# Altium footprint library Footprint.PcbLib: 137 footprints (part 5 of 9)
Each footprint in its own frame and in the unit in brackets; x right, y up, seen from the top. Pads: shape width x height; smd on the part's side, far side on the other; paste and mask are expansions set on the pad; w line width, h text height; cw(c..) or ccw(c..) is an arc to the next point about the centre after c.
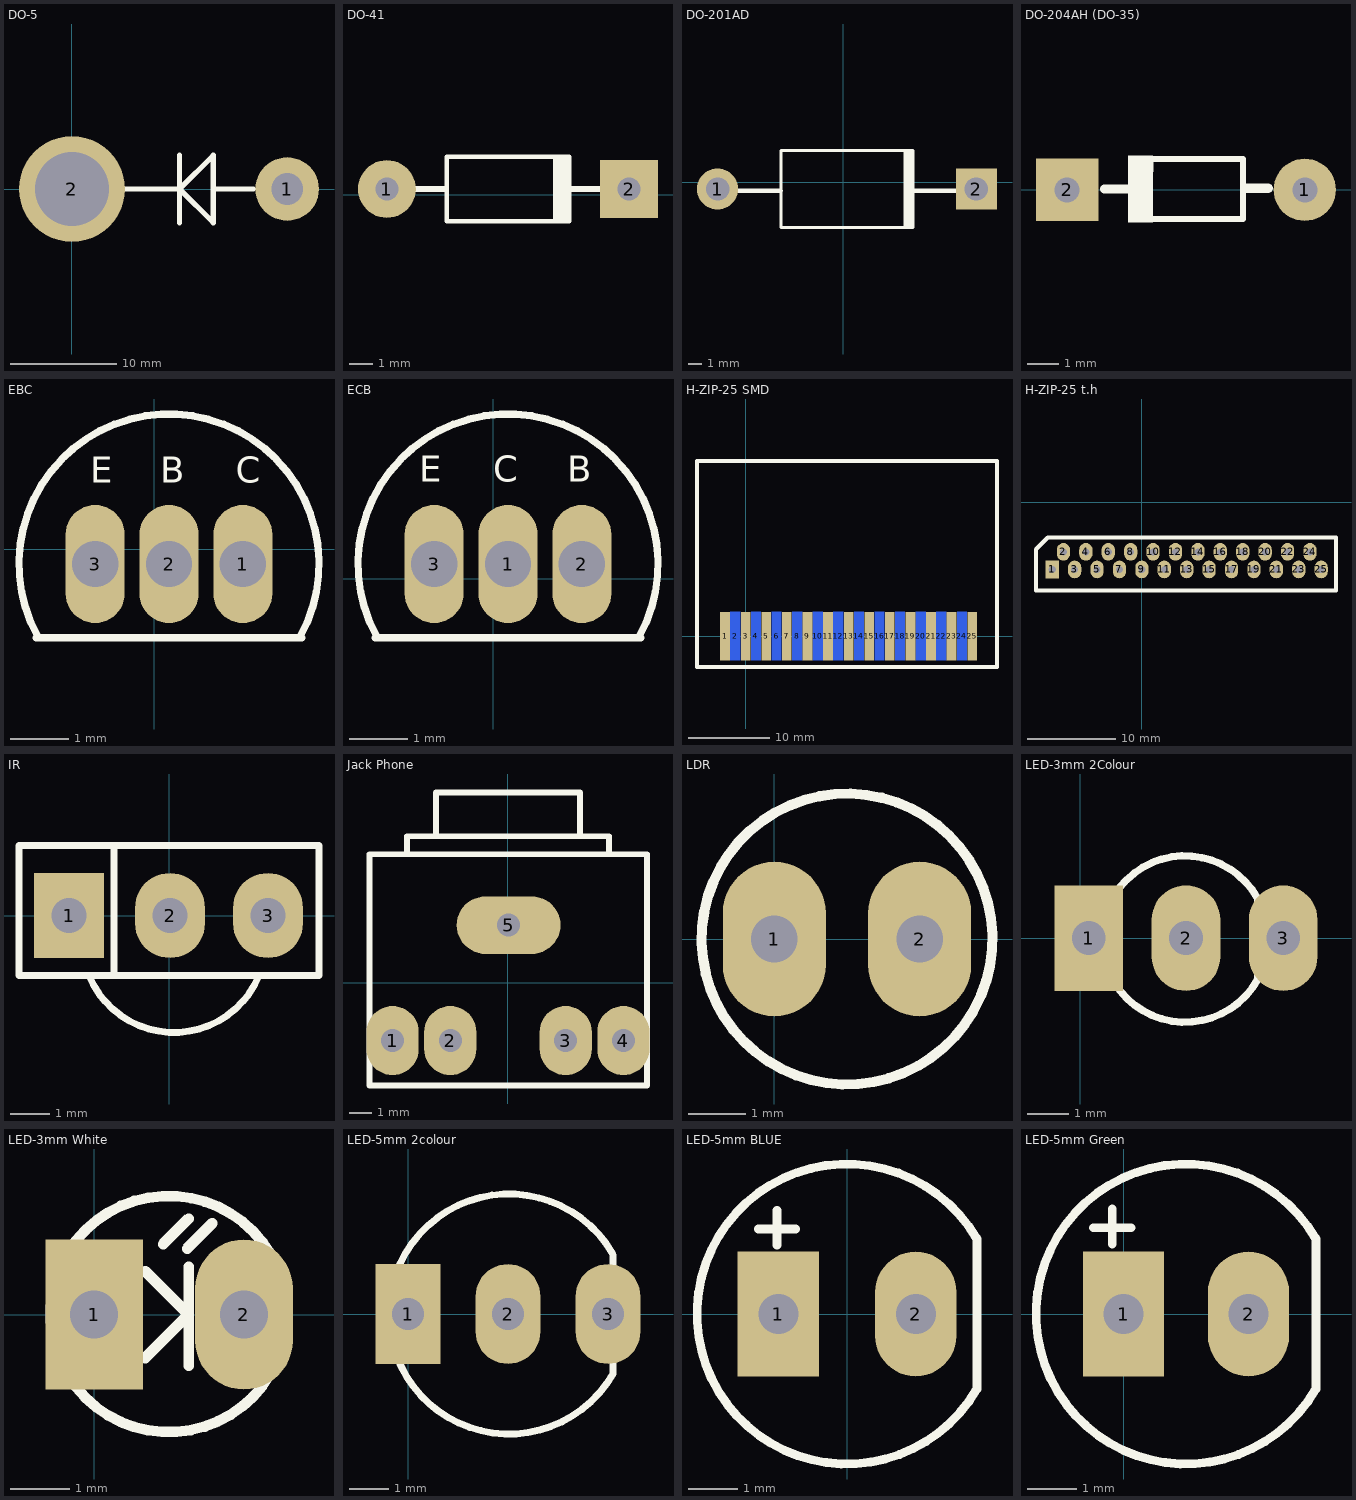
[diagram p4: the footprints below, top view; thin cyan lines are the x and y axes]

## DO-5 [mm] "diode power"
pads (2):
  round 6 hole 3: 1(20.32,0)
  round 10 hole 7: 2(0,0)
Top Overlay:
  lines w0.5: 5.08,0 10.16,0 ; 10.16,-3.175 10.16,3.175 ; 17.145,0 13.335,0 ; 10.16,0 13.335,3.175 13.335,0 ; 10.16,0 13.335,-3.175 13.335,0
3D body "User Library-DO-203AA_DO-4.step": height 20.3, standoff -11.5, extent -6.369,-5.17 6.147,5.83

## DO-41 [mm] "Diode pitch=300mils"
pads (2):
  round 2.5 hole 1: 1(-30.122,0.254)
  rect 2.5x2.5 hole 1: 2(-19.662,0.254)
Top Overlay:
  rectangle: -22.942,-1.146 -22.142,1.654
  lines w0.2: -22.242,-1.146 -27.542,-1.146 -27.542,1.654 -22.242,1.654
  lines w0.254: -30.099,0.254 -27.559,0.254 ; -22.225,0.254 -19.685,0.254
3D body "User Library-DO-41 10mm.step": height 3.36, standoff -2, extent -30.293,-1.108 -19.433,1.617

## DO-201AD [mm] "diode pitch=750mils"
pads (2):
  round 3 hole 1.7: 1(-9.144,-0.508)
  rect 3x3 hole 1.7: 2(9.696,-0.508)
Top Overlay:
  rectangle: 4.376,-3.308 5.176,2.292
  lines w0.2: 5.076,-3.308 -4.524,-3.308 -4.524,2.292 5.076,2.292
  lines w0.3: -7.62,-0.635 -4.524,-0.635 ; 4.953,-0.635 8.128,-0.635
3D body "User Library-DO-201ADDO-27.step": height 6.82, standoff -2.8, extent -9.943,-3.481 10.197,2.159

## DO-204AH (DO-35) [mm] "DO-204AH pitch=300mils"
pads (2):
  round 2 hole 0.8: 1(-2.54,0)
  rect 2x2 hole 0.8: 2(-10.16,0)
Top Overlay:
  rectangle: -8.204,-1.041 -7.404,1.092
  lines w0.2: -7.599,-0.94 -4.521,-0.94 -4.521,0.991 -7.497,0.991 -7.497,0.61
  lines w0.3: -8.963,0.025 -7.696,0.025 ; -4.47,0.051 -3.708,0.051
3D body "User Library-DO-204AH (DO-35).step": height 2.21, standoff -1.8, extent -10.318,-0.985 -2.178,1.035

## EBC [mil] "Transistor EBC"
pads (3):
  oval 40x80 hole 31.49 unplated: 1(60,-10) 2(10,-10) 3(-40,-10)
Top Overlay:
  lines w5: -80,-60 100,-60 ; -78.94,-59.1 cw(c10,-10) 98.94,-59.1
  text "C" at 55.12,39.37 h30
  text "B" at 3.94,39.37 h30
  text "E" at -43.31,39.37 h30
3D body: height 314.96, standoff 157.48, extent -79.57,-58.23 97.6,79.57
3D body: height 196.85, standoff -39.37, extent 46.42,-20.78 69.99,2.75
3D body: height 196.85, standoff -39.37, extent -2.8,-21.76 20.78,1.76
3D body: height 196.85, standoff -39.37, extent -53.98,-20.78 -30.4,2.75

## ECB [mil] "Transistor ECB"
pads (3):
  oval 40x80 hole 31.49 unplated: 1(10,10) 2(60,10) 3(-40,10)
Top Overlay:
  lines w5: -80,-40 100,-40 ; -78.94,-39.1 cw(c10,10) 98.94,-39.1
  text "C" at 0,60 h30
  text "B" at 50,60 h30
  text "E" at -50,60 h30
3D body: height 314.96, standoff 157.48, extent -79.57,-38.23 97.6,99.57
3D body: height 196.85, standoff -39.37, extent 46.42,-0.78 69.99,22.75
3D body: height 196.85, standoff -39.37, extent -2.8,-1.76 20.78,21.76
3D body: height 196.85, standoff -39.37, extent -53.98,-0.78 -30.4,22.75

## H-ZIP-25 SMD [mm] "H-ZIP-25 SMD"
pads (25):
  rect 1.2x6 smd: 1(-2.54,0) 3(0,0) 5(2.54,0) 7(5.08,0) 9(7.62,0) 11(10.16,0) 13(12.7,0) 15(15.24,0) 17(17.78,0) 19(20.32,0) 21(22.86,0) 23(25.4,0) 25(27.94,0)
  rect 1.2x6 smd far side: 2(-1.27,0) 4(1.27,0) 6(3.81,0) 8(6.35,0) 10(8.89,0) 12(11.43,0) 14(13.97,0) 16(16.51,0) 18(19.05,0) 20(21.59,0) 22(24.13,0) 24(26.67,0)
Top Overlay:
  lines w0.5: -6,-3.81 -6,21.59 31,21.59 31,-3.81 -6,-3.81
Bottom Overlay:
  lines w0.5: -6,-3.81 -6,21.59 31,21.59 31,-3.81 -6,-3.81
3D body "User Library-HZIP25-P1_27mm.step": height 1.12, standoff -3.88, extent -5.3,0.891 30.7,21.59

## H-ZIP-25 t.h [mm] "HZIP-25 (TB6560)"
pads (25):
  rect 1.5x2 hole 0.8: 1(-10.16,-7.62)
  oval 1.5x2 hole 0.8: 2(-8.89,-5.62) 3(-7.62,-7.62) 4(-6.35,-5.62) 5(-5.08,-7.62) 6(-3.81,-5.62) 7(-2.54,-7.62) 8(-1.27,-5.62) 9(0,-7.62) 10(1.27,-5.62) 11(2.54,-7.62) 12(3.81,-5.62) 13(5.08,-7.62) 14(6.35,-5.62) 15(7.62,-7.62) 16(8.89,-5.62) 17(10.16,-7.62) 18(11.43,-5.62) 19(12.7,-7.62) 20(13.97,-5.62) 21(15.24,-7.62) 22(16.51,-5.62) 23(17.78,-7.62) 24(19.05,-5.62) 25(20.32,-7.62)
Top Overlay:
  lines w0.5: -12,-10 -12,-9 -12,-5.32 -10.68,-4 22,-4 22,-10 -12,-10
3D body "User Library-HZIP25-P1_27mm.step": height 18.7, standoff -2, extent -12.962,-8.073 23.038,-3.073

## IR [mil] "mat thu hong ngoai"
pads (3):
  rect 70x85 hole 35: 1(-100,0)
  oval 70x85 hole 35: 2(1,0) 3(99,0)
Top Overlay:
  lines w7: -80,-60 ccw(c5,-25) 90,-60 ; -55,-60 -55,70 ; -150,-60 -150,70 150,70 150,-60 -150,-60
3D body "User Library-Parallax-IR.step": height 393.7, standoff -78.74, extent -135.59,-160 140,376.42

## Jack Phone [mil] "Jac Phone Stereo"
pads (5):
  oval 90.55x120 hole 40: 1(-200,-100) 2(-100,-100) 3(100,-100) 4(200,-100)
  oval 180x100 hole 40: 5(1,100)
Top Overlay:
  lines w10: -240,219 -240,-178 ; -175,224 -175,254 175,254 175,226 174,225 ; -125,255 -125,330 125,330 ; 125,329 125,256 126,255 ; 240,-178 -240,-178 ; -240,-178 241,-178 241,223 -240,223 -240,-178
3D body "SW3dPS-CONNECTOR, PHONE JACK, STEREO, 3.5 MM, SEE-PLUS ST-3536-02HG.STEP": height 394.3, standoff -137.19, extent -239,-201.56 233.44,353.56

## LDR [mm] "QUANG TRO"
height 7.62
pads (2):
  oval 1.8x2.7 hole 0.813: 1(0,0) 2(2.54,0)
Top Overlay:
  lines w0.178: 3.47,-1.269 cw(c1.27,0) 3.49,-1.234
3D body "LDR.STEP": height 3.51, standoff -1.23, extent -1.335,-2.032 3.875,2.268

## LED-3mm 2Colour [mil] "LED-3mm 2Colour"
height 300
pads (3):
  rect 65x100 hole 32: 1(8,0)
  oval 65x100 hole 32: 2(100,0) 3(192,0)
Top Overlay:
  lines w7: 168,-39 168,37
  lines w7.01: 167.87,37.48 ccw(c99.08,-0.84) 167.97,-38.98
3D body "User Library-LED RG.step": height 371.26, standoff -157.48, extent 9.83,-81.48 187,75.99

## LED-3mm White [mil] "LED-3mm White"
height 300
pads (2):
  rect 65x100 hole 32: 1(0,0)
  oval 65x100 hole 32: 2(100,0)
Top Overlay:
  lines w7: 34,-29 63,0 34,29 ; 46,47 63,64 ; 62,44 79,61 ; 63,-34 63,32 ; 117.92,-39.35 117.92,39.84
  lines w7.01: 117.57,-39.74 cw(c49.8,0.35) 117.72,40.19
3D body "SW3DPS-LED DIP 3MM-DEFAULT.STEP": height 217.14, standoff -117.51, extent -24.8,-74.81 112.99,74.8

## LED-5mm 2colour [mil] "LED-5mm 2colour"
height 300
pads (3):
  rect 65x100 hole 32: 1(0,0)
  oval 65x100 hole 32: 2(100,0) 3(200,0)
Top Overlay:
  lines w7: 204.51,60.71 ccw(c101,0) 204.94,-59.97 ; 205,-59 205,59
3D body "User Library-5mmBiColorLED.step": height 426.6, standoff -102.4, extent -16,-115.98 210,115.98

## LED-5mm BLUE [mil] "LED-5mm BLUE"
height 300
pads (2):
  rect 65x100 hole 32: 1(-55,0)
  oval 65x100 hole 32: 2(55,0)
Top Overlay:
  lines w7: -71,68 -41,68 ; -56,55 -56,83 ; 103.51,60.71 ccw(c0,0) 103.94,-59.97 ; 104,-59 104,60
3D body "User Library-LEDd5B.STEP": height 339.18, standoff -243.49, extent -113.31,-120.49 100.08,116.5

## LED-5mm Green [mil] "LED-5mm Green"
height 300
pads (2):
  rect 65x100 hole 32: 1(0,0)
  oval 65x100 hole 32: 2(100,0)
Top Overlay:
  lines w7: -24,69 6,69 ; -9,56 -9,84 ; 153.51,60.71 ccw(c50,0) 153.94,-59.97 ; 154,-59 154,60
3D body "SW3dPS-LEDd5G.STEP": height 339.18, standoff -243.49, extent -68.69,-119.99 144.69,117